# Altium footprint library mastermind.PCBLIB: 1061 footprints (part 17 of 67)
Each footprint in its own frame and in the unit in brackets; x right, y up, seen from the top. Pads: shape width x height; smd on the part's side, far side on the other; paste and mask are expansions set on the pad; w line width, h text height; cw(c..) or ccw(c..) is an arc to the next point about the centre after c.
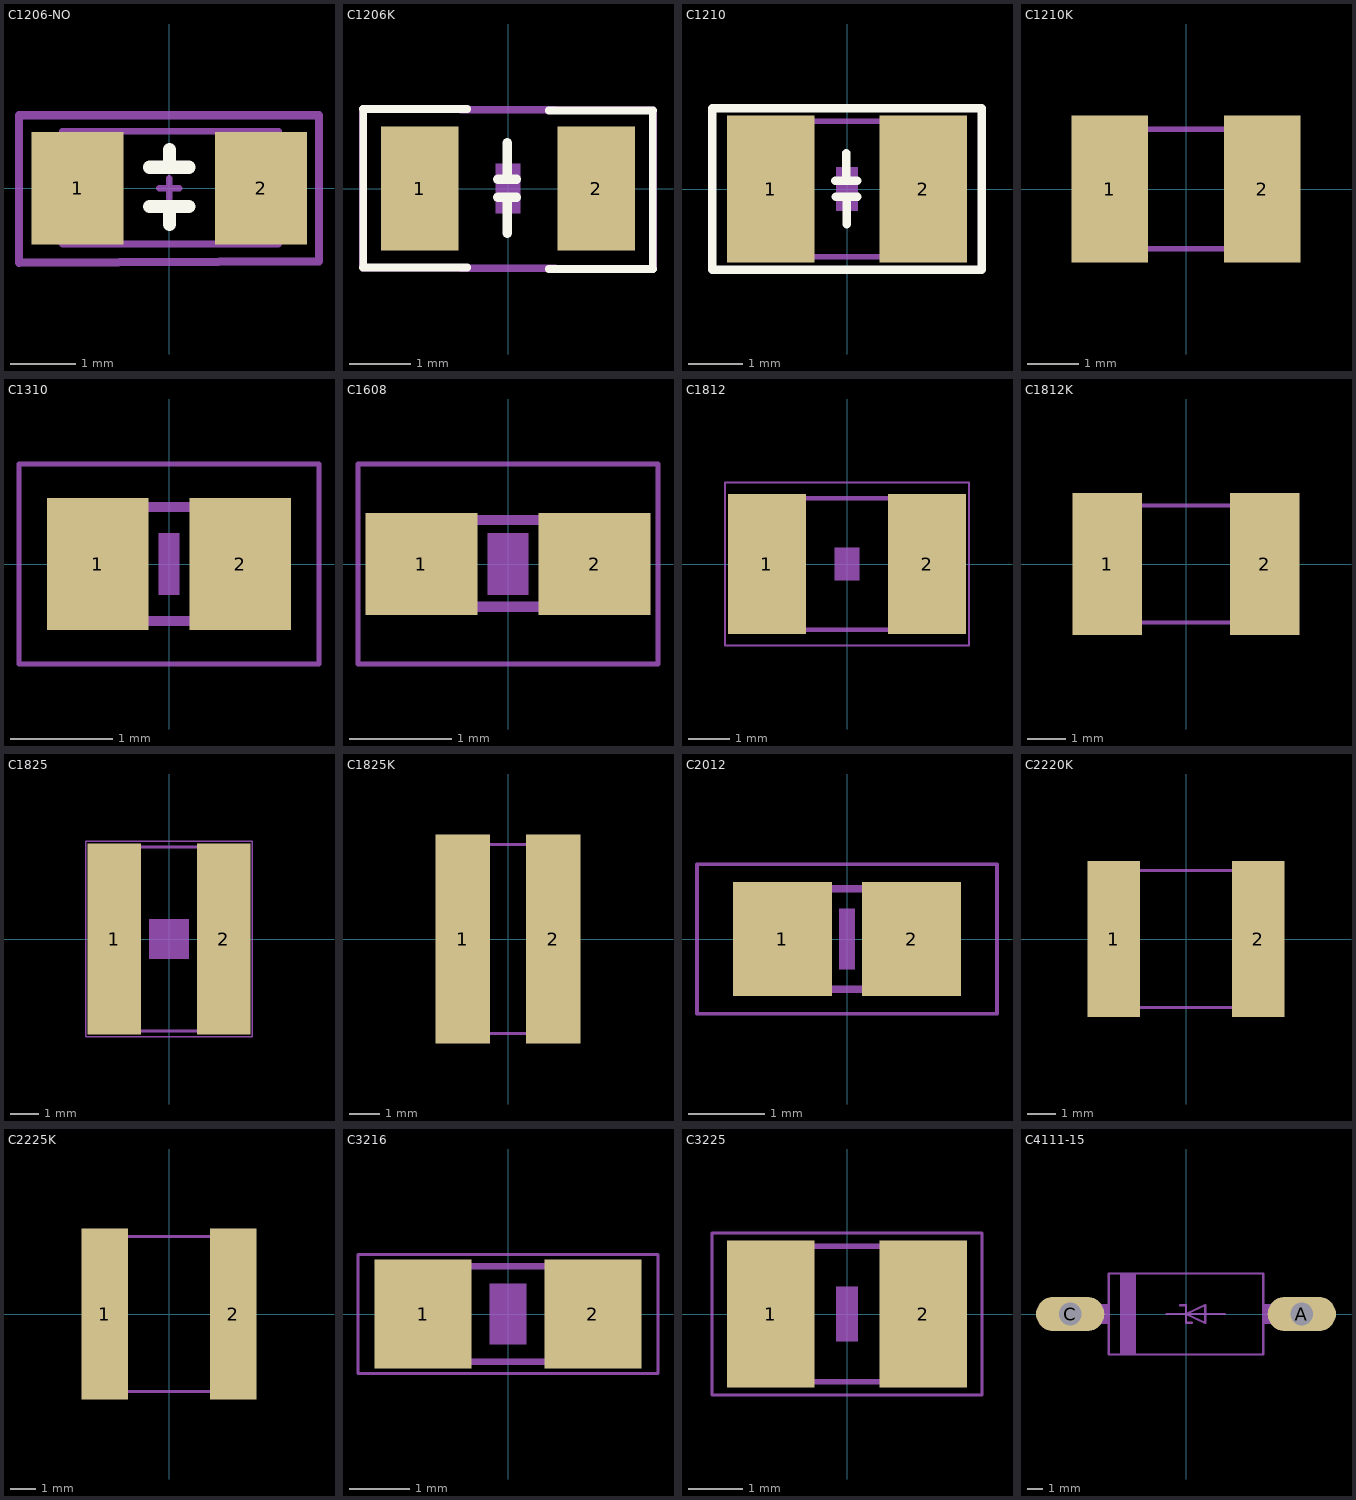
[diagram p16: the footprints below, top view; thin cyan lines are the x and y axes]

## C1206-NO [mm]
pads (2):
  rect 1.4x1.72 smd: 1(-1.4,0) 2(1.4,0)
Top Overlay:
  lines w0.2: -0.3,-0.28 0.3,-0.28 ; -0.3,0.32 0.3,0.32 ; 0,-0.55 0,-0.28 ; 0,0.32 0,0.59
Mechanical 8:
  region: -1.702,-0.851 -1.702,0.849 -0.952,0.849 -0.952,-0.851
  region: 0.952,-0.849 0.952,0.851 1.702,0.851 1.702,-0.849
Mechanical 13:
  lines w0.1: -0.15,0 0.15,0 ; 0,-0.15 0,0.15 ; -1.631,-0.851 1.667,-0.851 1.667,0.87 -1.631,0.87 -1.631,-0.851
Mechanical 15:
  lines w0.127: -2.295,-1.138 -2.295,1.116 2.285,1.116 2.285,-1.115 -2.295,-1.138
  text ".Designator" at -1.631,-0.15 h1
3D body "C1206_145.step": height 1.45, standoff 0, extent -1.587,-0.787 1.613,0.813

## C1206K [mm]
pads (2):
  rect 1.25x2 smd: 1(-1.427,0) 2(1.427,0)
Top Overlay:
  lines w0.12: -2.345,-1.277 -2.345,1.287 ; 2.345,-1.302 2.345,1.262
  lines w0.127: -2.345,-1.277 -0.66,-1.277 ; -2.345,1.287 -0.66,1.287 ; 0.66,-1.302 2.345,-1.302 ; 0.66,1.262 2.345,1.262
  lines w0.152: -0.163,-0.14 0.137,-0.14 ; -0.163,0.152 0.137,0.152 ; -0.013,-0.725 -0.013,-0.14 ; -0.013,0.152 -0.013,0.737
Mechanical 8:
  region: 1.1,-0.8 1.1,0.8 1.6,0.8 1.6,-0.8
  region: -1.6,-0.8 -1.6,0.8 -1.1,0.8 -1.1,-0.8
Mechanical 29:
  lines w0.127: -2.345,-1.277 2.345,-1.302 2.345,1.262 -2.345,1.287 -2.345,-1.277
Mechanical 30:
  region: -0.2,-0.4 -0.2,0.4 0.2,0.4 0.2,-0.4
3D body "CircuitWorks-CAPACITOR 1206.STEP": height 1.63, standoff -0.03, extent -1.625,-0.755 1.575,0.805

## C1210 [mm]
pads (2):
  rect 1.6x2.7 smd: 1(-1.4,0) 2(1.4,0)
Top Overlay:
  lines w0.152: -0.213,0.152 0.187,0.152 ; -0.206,-0.14 0.194,-0.14 ; -0.013,0.152 -0.013,0.66 ; -0.006,-0.648 -0.006,-0.14 ; -2.473,-1.483 -2.473,1.483 2.473,1.483 2.473,-1.483 -2.473,-1.483
Mechanical 8:
  region: 0.952,-1.305 0.952,1.295 1.702,1.295 1.702,-1.305
  region: -1.702,-1.295 -1.702,1.305 -0.952,1.305 -0.952,-1.295
  lines w0.102: -0.965,-1.245 0.965,-1.245 ; -0.965,1.245 0.965,1.245
Mechanical 30:
  region: -0.2,-0.4 -0.2,0.4 0.2,0.4 0.2,-0.4
3D body "C1210_170.step": height 1.7, standoff 0, extent -1.59,-1.25 1.61,1.25

## C1210K [mm]
pads (2):
  rect 1.5x2.9 smd: 1(-1.5,0) 2(1.5,0)
Mechanical 8:
  region: 1.1,-1.25 1.1,1.25 1.6,1.25 1.6,-1.25
  region: -1.6,-1.25 -1.6,1.25 -1.1,1.25 -1.1,-1.25
  lines w0.102: -1.525,-1.175 1.525,-1.175 ; -1.525,1.175 1.525,1.175

## C1310 [mm]
pads (2):
  rect 1x1.3 smd: 1(-0.7,0) 2(0.7,0)
Mechanical 8:
  region: 0.279,-0.622 0.279,0.628 0.659,0.628 0.659,-0.622
  region: -0.66,-0.622 -0.66,0.628 -0.28,0.628 -0.28,-0.622
  lines w0.102: -0.294,-0.559 0.294,-0.559 ; -0.294,0.559 0.294,0.559
Mechanical 30:
  region: -0.1,-0.3 -0.1,0.3 0.1,0.3 0.1,-0.3
Mechanical 29 (Mech34):
  lines w0.051: -1.473,-0.983 -1.473,0.983 1.473,0.983 1.473,-0.983 -1.473,-0.983

## C1608 [mm]
pads (2):
  rect 1.1x1 smd: 1(-0.85,0) 2(0.85,0)
Mechanical 8:
  region: -0.838,-0.47 -0.838,0.48 -0.338,0.48 -0.338,-0.47
  region: 0.33,-0.47 0.33,0.48 0.83,0.48 0.83,-0.47
  lines w0.102: -0.356,-0.419 0.356,-0.419 ; -0.356,0.432 0.356,0.432
Mechanical 30:
  region: -0.2,-0.3 -0.2,0.3 0.2,0.3 0.2,-0.3
Mechanical 29 (Mech34):
  lines w0.051: -1.473,-0.983 1.473,-0.983 1.473,0.983 -1.473,0.983 -1.473,-0.983

## C1812 [mm]
pads (2):
  rect 1.9x3.4 smd: 1(-1.95,0) 2(1.95,0)
Mechanical 8:
  region: 1.448,-1.651 1.448,1.649 2.398,1.649 2.398,-1.651
  region: -2.388,-1.651 -2.388,1.649 -1.438,1.649 -1.438,-1.651
  lines w0.102: -1.473,1.6 1.473,1.6 ; -1.448,-1.6 1.473,-1.6
Mechanical 30:
  region: -0.3,-0.4 -0.3,0.4 0.3,0.4 0.3,-0.4
Mechanical 29 (Mech34):
  lines w0.051: -2.973,-1.983 -2.973,1.983 2.973,1.983 2.973,-1.983 -2.973,-1.983

## C1812K [mm]
pads (2):
  rect 1.8x3.7 smd: 1(-2.05,0) 2(2.05,0)
Mechanical 8:
  region: 1.65,-1.6 1.65,1.6 2.25,1.6 2.25,-1.6
  region: -2.25,-1.6 -2.25,1.6 -1.65,1.6 -1.65,-1.6
  lines w0.102: -2.175,-1.525 2.175,-1.525 ; -2.175,1.525 2.175,1.525

## C1825 [mm]
pads (2):
  rect 1.9x6.8 smd: 1(-1.95,0) 2(1.95,0)
Mechanical 8:
  region: -2.413,-3.353 -2.413,3.347 -1.463,3.347 -1.463,-3.353
  region: 1.448,-3.353 1.448,3.347 2.398,3.347 2.398,-3.353
  lines w0.102: -1.499,3.277 1.473,3.277 ; -1.473,-3.277 1.499,-3.277
Mechanical 30:
  region: -0.7,-0.7 -0.7,0.7 0.7,0.7 0.7,-0.7
Mechanical 29 (Mech34):
  lines w0.051: -2.973,-3.483 2.973,-3.483 2.973,3.483 -2.973,3.483 -2.973,-3.483

## C1825K [mm]
pads (2):
  rect 1.8x6.9 smd: 1(-1.5,0) 2(1.5,0)
Mechanical 8:
  region: 1.1,-3.2 1.1,3.2 1.6,3.2 1.6,-3.2
  region: -1.6,-3.2 -1.6,3.2 -1.1,3.2 -1.1,-3.2
  lines w0.102: -1.525,-3.125 1.525,-3.125 ; -1.525,3.125 1.525,3.125

## C2012 [mm]
pads (2):
  rect 1.3x1.5 smd: 1(-0.85,0) 2(0.85,0)
Mechanical 8:
  region: -1.092,-0.724 -1.092,0.726 -0.342,0.726 -0.342,-0.724
  region: 0.356,-0.724 0.356,0.726 1.106,0.726 1.106,-0.724
  lines w0.102: -0.381,0.66 0.381,0.66 ; -0.356,-0.66 0.381,-0.66
Mechanical 30:
  region: -0.1,-0.4 -0.1,0.4 0.1,0.4 0.1,-0.4
Mechanical 29 (Mech34):
  lines w0.051: -1.973,-0.983 1.973,-0.983 1.973,0.983 -1.973,0.983 -1.973,-0.983

## C2220K [mm]
pads (2):
  rect 1.85x5.5 smd: 1(-2.55,0) 2(2.55,0)
Mechanical 8:
  region: 2.2,-2.5 2.2,2.5 2.8,2.5 2.8,-2.5
  region: -2.8,-2.5 -2.8,2.5 -2.2,2.5 -2.2,-2.5
  lines w0.102: -2.725,-2.425 2.725,-2.425 ; -2.725,2.425 2.725,2.425

## C2225K [mm]
pads (2):
  rect 1.85x6.8 smd: 1(-2.55,0) 2(2.55,0)
Mechanical 8:
  region: 2.2,-3.15 2.2,3.15 2.8,3.15 2.8,-3.15
  region: -2.8,-3.15 -2.8,3.15 -2.2,3.15 -2.2,-3.15
  lines w0.102: -2.725,-3.075 2.725,-3.075 ; -2.725,3.075 2.725,3.075

## C3216 [mm]
pads (2):
  rect 1.6x1.8 smd: 1(-1.4,0) 2(1.4,0)
Mechanical 8:
  region: -1.702,-0.851 -1.702,0.849 -0.952,0.849 -0.952,-0.851
  region: 0.952,-0.849 0.952,0.851 1.702,0.851 1.702,-0.849
  lines w0.102: -0.965,-0.787 0.965,-0.787 ; -0.965,0.787 0.965,0.787
Mechanical 30:
  region: -0.3,-0.5 -0.3,0.5 0.3,0.5 0.3,-0.5
Mechanical 29 (Mech34):
  lines w0.051: -2.473,-0.983 2.473,-0.983 2.473,0.983 -2.473,0.983 -2.473,-0.983

## C3225 [mm]
pads (2):
  rect 1.6x2.7 smd: 1(-1.4,0) 2(1.4,0)
Mechanical 8:
  region: 0.952,-1.305 0.952,1.295 1.702,1.295 1.702,-1.305
  region: -1.702,-1.295 -1.702,1.305 -0.952,1.305 -0.952,-1.295
  lines w0.102: -0.965,-1.245 0.965,-1.245 ; -0.965,1.245 0.965,1.245
Mechanical 30:
  region: -0.2,-0.5 -0.2,0.5 0.2,0.5 0.2,-0.5
Mechanical 29 (Mech34):
  lines w0.051: -2.473,-1.483 -2.473,1.483 2.473,1.483 2.473,-1.483 -2.473,-1.483

## C4111-15 [mil]
pads (2):
  oval 177x88.5 hole 59: A(300,0) C(-300,0)
Mechanical 2:
  region: -235,-25 -235,25 -200,25 -200,-25
  region: 200,-25 200,25 235,25 235,-25
  region: -170,-105 -170,105 -130,105 -130,-105
  lines w6: -50,0 0,0 ; -15,23 0,23 0,0 ; 15,-23 0,-23 0,0 ; 100,0 0,0 ; 0,0 50,23 50,-23 0,0 ; -200,-105 -200,105 200,105 200,-105 -200,-105
Mechanical 8:
  lines w50: -300,0 -245,0 ; 245,0 300,0